# Altium integrated library Inductor-THP_V2.IntLib: 60 symbols
Pins are listed as number, name and electrical type; pins without a type are passive.

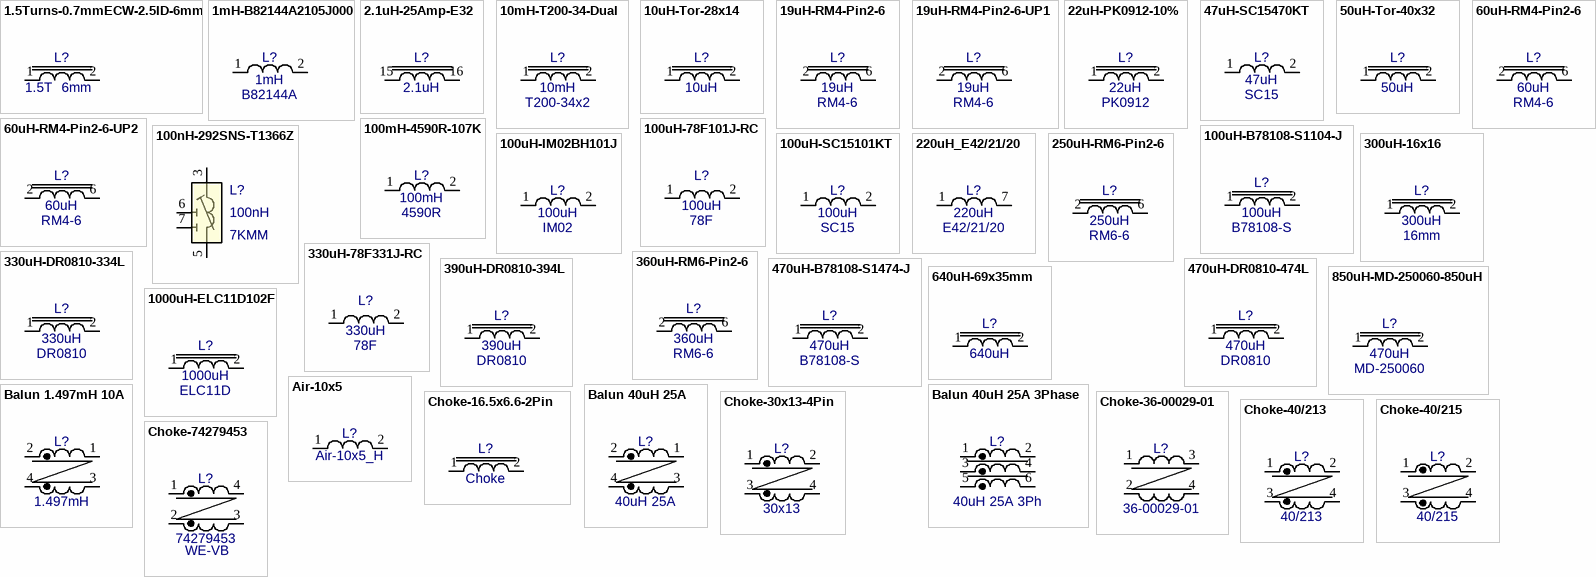
[diagram p0: symbols 1.5Turns-0.7mmECW-2.5ID-6mm to Choke-74279453]

## 1.5Turns-0.7mmECW-2.5ID-6mm
designator L?  value 1.5T  Text2: 6mm  (hidden comment: 1.5Turns-0.7mmECW-2.5ID-6mm)
Inductor 1.5Turns-0.7mmECW-2.5ID-6mm; Manufacturer: Owner; Part Number: 1.5Turns-0.7mmECW-2.5ID-6mm; Package: 1.5T-0.7ECW-2.5ID-6mm; EDM-PN: *; Tol: *; Text1: *
footprint 1.5T-0.7ECW-2.5ID-6mm (1.5Turns-0.7mmECW-2.5ID-6mm)
pins: 1, 2

## 1mH-B82144A2105J000
designator L?, comment value 1mH  Text2: B82144A  (hidden comment: B82144A2105J000)
Inductor Dual Core T200-34; Manufacturer: Epcos; Tol: 5%; Part Number: B82144A2105J000; Package: Ind-50.8x31.75-14mm-2Pin; EDM-PN: *; Text1: *
footprint Ind-THP-12.0x5.2 (Inductor THP 12.0x5.2mm)
pins: 1, 2

## 2.1uH-25Amp-E32
designator L?  value 2.1uH  (hidden comment: 2.1uH-25Amp-E32)
Inductor 25Amp; Manufacturer: Owner; Part Number: 2.1uH-25Amp-E32; Package: E32-7pin+2Power; EDM-PN: *; Tol: *; Text1: *; Text2: *
footprint E32-7pin+2Power (E32-7pin+2Power 35x37.5mm)
pins: 15, 16

## 10mH-T200-34-Dual
designator L?  value 10mH  Text2: T200-34x2  (hidden comment: 10mH-T200-34-Dual)
Inductor Dual Core T200-34; Manufacturer: Owner; Tol: 20%; Part Number: 10mH-T200-34-Dual; Package: Ind-50.8x31.75-14mm-2Pin; EDM-PN: *; Text1: *
footprint Ind-50.8x31.75-14mm-2Pin (Inductor 50.8x31.75mm Dual Core)
pins: 1, 2

## 10uH-Tor-28x14
designator L?  value 10uH  (hidden comment: 10uH-Tor-28x14)
Inductor Radial 20Amp; Manufacturer: Various; Part Number: 10uH-Tor-28x14; Package: IND-Tor-28x14-2Pin; EDM-PN: *; Tol: *; Text1: *; Text2: *
footprint IND-Tor-28x14-2Pin (Tor 28x14mm)
pins: 1, 2

## 19uH-RM4-Pin2-6
designator L?  value 19uH  Text2: RM4-6  (hidden comment: 19uH-RM4-Pin2-6)
Coil RM4 Core; Manufacturer: Various; Part Number: 19uH-RM4-Pin2-6; Package: RM4-6; EDM-PN: *; Text1: *
footprint RM4-6 (RM4 6 pin 9.8x9.8mm)
pins: 2, 6

## 19uH-RM4-Pin2-6-UP1
designator L?  value 19uH  Text2: RM4-6  (hidden comment: 19uH-RM4-Pin2-6-UP1)
Coil RM4 Core (Detnet UP1); Part Number: UP1-19uH-RM4-Pin2-6; Manufacturer: Detnet; Package: RM4-6; EDM-PN: *; Text1: *
footprint RM4-6 (RM4 6 pin 9.8x9.8mm)
pins: 2, 6

## 22uH-PK0912-10%
designator L?, comment value 22uH  Text2: PK0912  (hidden comment: PK0912-220K-C0-B/27M2921)
Inductor Radial 2Amp; Manufacturer: Fenfa; Tol: 10%; Part Number: PK0912-220K-C0-B/27M2921; Package: IND-PK0912; EDM-PN: *; Text1: *
footprint IND-PK0912 (PK0921 10.5x14.0mm)
pins: 1, 2

## 47uH-SC15470KT
designator L?, comment value 47uH  Text2: SC15  (hidden comment: SC15470KT)
Inductor Fixed; Manufacturer: Tyco; Tol: 10%; Part Number: SC15470KT; Package: Ind-THP-SC15; EDM-PN: *; Text1: *
footprint Ind-THP-SC15 (Inductor THP SC15 10.0x4.5mm)
pins: 1, 2

## 50uH-Tor-40x32
designator L?  value 50uH  (hidden comment: 50uH-Tor-40x32)
Inductor Radial; Manufacturer: Various; Part Number: 50uH-Tor-40x32; Package: IND-Tor-40x32-2Pin; EDM-PN: *; Tol: *; Text1: *; Text2: *
footprint IND-Tor-40x32-2Pin (Tor 40.0x32.0mm)
pins: 1, 2

## 60uH-RM4-Pin2-6
designator L?  value 60uH  Text2: RM4-6  (hidden comment: 60uH-RM4-Pin2-6)
Coil RM4 Core; Manufacturer: Various; Part Number: 60uH-RM4-Pin2-6; Package: RM4-6; EDM-PN: *; Text1: *
footprint RM4-6 (RM4 6 pin 9.8x9.8mm)
pins: 2, 6

## 60uH-RM4-Pin2-6-UP2
designator L?  value 60uH  Text2: RM4-6  (hidden comment: 60uH-RM4-Pin2-6-UP2)
Coil RM4 Core (Detnet UP2); Part Number: UP2-60uH-RM4-Pin2-6; Manufacturer: Detnet; Package: RM4-6; EDM-PN: *; Text1: *
footprint RM4-6 (RM4 6 pin 9.8x9.8mm)
pins: 2, 6

## 100mH-4590R-107K
designator L?, comment value 100mH  Text2: 4590R  (hidden comment: 4590R-107K)
Inductor High Current Filter; Manufacturer: API Delevan; Tol: 10%; Part Number: 4590R-107K; Package: IND-4590-22.8x11.55mm; EDM-PN: *; Text1: *
footprint IND-4590-22.8x11.55mm (4590 22.8x11.55mm)
pins: 1, 2

## 100nH-292SNS-T1366Z
designator L?  value 100nH  Text2: 7KMM  (hidden comment: 100nH-292SNS-T1366Z)
Inductor Variable; Manufacturer: Toko; Tol: 6%; Part Number: 292SNS-T1366Z; Package: Toko-7KMM; EDM-PN: *; Text1: *
footprint Toko-7KMM (7KMM 7.8x7.8mm)
pins: 3 1, 5 2, 6 (power), 7 (power)

## 100uH-78F101J-RC
designator L?, comment value 100uH  Text2: 78F  (hidden comment: 78F101J-RC)
Inductor Unshielded Wirewound 160mA; Manufacturer: Bourns; Tol: 5%; Part Number: 78F101J-RC; Package: Ind-THP-7.1x2.79; EDM-PN: *; Text1: *
footprint Ind-THP-7.1x2.79 (Inductor THP 9.4x4.0mm)
pins: 1, 2

## 100uH-B78108-S1104-J
designator L?, comment value 100uH  Text2: B78108-S  (hidden comment: B78108-S1104-J)
Inductor RF Choke; Manufacturer: Epcos; Tol: 20%; Part Number: B78108-S1104-J; Package: Ind-THP-9.4x4.0; EDM-PN: *; Text1: *
footprint Ind-THP-9.4x4.0 (Inductor THP 9.4x4.0mm)
pins: 1, 2

## 100uH-IM02BH101J
designator L?, comment value 100uH  Text2: IM02  (hidden comment: IM02BH101J)
Inductor Fixed; Manufacturer: Vishay; Tol: 5%; Part Number: IM02BH101J; Package: Ind-THP-IM02; EDM-PN: *; Text1: *
footprint Ind-THP-IM02 (Inductor THP IM-02 6.6x2.67mm)
pins: 1, 2

## 100uH-SC15101KT
designator L?, comment value 100uH  Text2: SC15  (hidden comment: SC15101KT)
Inductor Fixed; Manufacturer: Tyco; Tol: 10%; Part Number: SC15101KT; Package: Ind-THP-SC15; EDM-PN: *; Text1: *
footprint Ind-THP-SC15 (Inductor THP SC15 10.0x4.5mm)
pins: 1, 2

## 220uH_E42/21/20
designator L?  value 220uH  Text2: E42/21/20  (hidden comment: 220uH_E42/21/20)
Inductor 12Amp E42/21/20 & FE0250; Manufacturer: Various/Miles-platts; Part Number: E42/21/20 & FE0250; Package: IND-E42-21-20 12PIN-HORZ; EDM-PN: *; Tol: *; Text1: *
footprint IND-E42-21-20 12PIN-HORZ (E42-21-20 12PIN)
pins: 1, 7

## 250uH-RM6-Pin2-6
designator L?  value 250uH  Text2: RM6-6  (hidden comment: 250uH-RM6-Pin2-6)
Coil RM6 Core; Manufacturer: Various; Part Number: 250uH-RM6-Pin2-6; Package: RM6-6; EDM-PN: *; Text1: *
footprint RM6-6 (RM6 6 0.0x0.0mm)
pins: 2, 6

## 300uH-16x16
designator L?, comment value 300uH  Text2: 16mm  (hidden comment: 300uH-16x16mm)
Inductor 16mm Dia; Manufacturer: Owner; Tol: 20%; Part Number: 300uH-16x16mm; Package: Ind-THP-16x16-2P; EDM-PN: *; Text1: *
footprint IND-THP-16x16-2P (Inductor 2Pin 16x16mm)
pins: 1, 2

## 330uH-78F331J-RC
designator L?, comment value 330uH  Text2: 78F  (hidden comment: 78F331J-RC)
Inductor Unshielded Wirewound 100mA; Manufacturer: Bourns; Tol: 5%; Part Number: 78F331J-RC; Package: Ind-THP-7.1x2.79; EDM-PN: *; Text1: *
footprint Ind-THP-7.1x2.79 (Inductor THP 9.4x4.0mm)
pins: 1, 2

## 330uH-DR0810-334L
designator L?, comment value 330uH  Text2: DR0810  (hidden comment: DR0810-334L)
Inductor Power; Manufacturer: Coilcraft; Tol: 10%; Part Number: DR0810-334L; Package: DR0810; EDM-PN: *; Text1: *
footprint DR0810 (DR0810 10.5x12.0mm)
pins: 1, 2

## 360uH-RM6-Pin2-6
designator L?  value 360uH  Text2: RM6-6  (hidden comment: 360uH-RM6-Pin2-6)
Coil RM6 Core; Manufacturer: Various; Part Number: 360uH-RM6-Pin2-6; Package: RM6-6; EDM-PN: *; Text1: *
footprint RM6-6 (RM6 6 0.0x0.0mm)
pins: 2, 6

## 390uH-DR0810-394L
designator L?, comment value 390uH  Text2: DR0810  (hidden comment: DR0810-394L)
Inductor Power; Manufacturer: Coilcraft; Tol: 10%; Part Number: DR0810-394L; Package: DR0810; EDM-PN: *; Text1: *
footprint DR0810 (DR0810 10.5x12.0mm)
pins: 1, 2

## 470uH-B78108-S1474-J
designator L?, comment value 470uH  Text2: B78108-S  (hidden comment: B78108-S1474-J)
Inductor RF Choke; Manufacturer: Epcos; Tol: 20%; Part Number: B78108-S1474-J; Package: Ind-THP-9.4x4.0; EDM-PN: *; Text1: *
footprint Ind-THP-9.4x4.0 (Inductor THP 9.4x4.0mm)
pins: 1, 2

## 470uH-DR0810-474L
designator L?, comment value 470uH  Text2: DR0810  (hidden comment: DR0810-474L)
Inductor Power; Manufacturer: Coilcraft; Tol: 10%; Part Number: DR0810-474L; Package: DR0810; EDM-PN: *; Text1: *
footprint DR0810 (DR0810 10.5x12.0mm)
pins: 1, 2

## 640uH-69x35mm
designator L?  value 640uH  (hidden comment: 640uH-69x35mm)
Inductor Power 10Amp; Manufacturer: Owner; Part Number: 640uH 69x35mm; Package: IND-65x35-2Pin; EDM-PN: *; Tol: *; Text1: *; Text2: *
footprint IND-65x35-2Pin (Inductor 65.0x35.0mm)
pins: 1, 2

## 850uH-MD-250060-850uH
designator L?, comment value 470uH  Text2: MD-250060  (hidden comment: MD-250060-850uH)
Inductor Power; Manufacturer: Owner; Tol: 10%; Part Number: MD-250060-850uH; Package: IND-Tor-72x38-2Pin; EDM-PN: *; Text1: *
footprint IND-Tor-72x38-2Pin (Tor 72.0x38.0mm)
pins: 1, 2

## 1000uH-ELC11D102F
designator L?, comment value 1000uH  Text2: ELC11D  (hidden comment: ELC11D102F)
Inductor RF Choke; Manufacturer: Panasonic; Tol: 10%; Part Number: ELC11D102F; Package: Ind-THP-9.4x4.0; EDM-PN: *; Text1: *
footprint IND-11.5x13.9-Radial (Ind 11.5x11.5mm)
pins: 1, 2

## Air-10x5
designator L?, comment value Air-10x5_H  (hidden comment: Inductor-Air-10x5)
Inductor Air Hand Wound; Manufacturer: Owner; Package: Inductor-Air-10; EDM-PN: *; Tol: *; Text1: *; Part Number: Air-10x5_H; Text2: *
footprint Inductor-Air-10 (Inductor-Air 10.0x5.0mm)
pins: 1, 2

## Balun 1.497mH 10A
designator L?  value 1.497mH  (hidden comment: Balun 1.497mH 10A)
Manufacturer: Owner; Part Number: Balun 1.497mH 10A; Package: CHOKE-26.6x11-4PI-Firing Solenoid; EDM-PN: *; Text1: *; Text2: *; Reutech PN: 5950-98-0165
footprint CHOKE-26.6x11-4PI-Firing Solenoid (CHOKE 26.6x26.6mm)
pins: 1, 2, 3, 4

## Balun 40uH 25A
designator L?  value 40uH 25A  (hidden comment: Balun 40uH 25A)
Balun 40uH 25A (B64290-K618-X830); Manufacturer: Owner; Part Number: Balun 40uH 25A; Package: Balun-28x12-4Pin; EDM-PN: *; Text1: *; Text2: *; Reutech PN: 5950-98-0159
footprint Balun-28x12-4Pin (Balun 28x28mm)
pins: 1, 2, 3, 4

## Balun 40uH 25A 3Phase
designator L?  value 40uH 25A 3Ph  (hidden comment: Balun 40uH 25A 3Phase)
Balun 40uH 25A 3 Phase (B64290-K618-X830); Manufacturer: Owner; Part Number: Balun 40uH 25A 3Ph; Package: Balun-28x12-6Pin; EDM-PN: *; Text1: *; Text2: *; Reutech PN: 5950-98-0160
footprint Balun-28x12-6Pin (Balun 28x28mm)
pins: 1, 2, 3, 4, 5, 6

## Choke-16.5x6.6-2Pin
designator L?, comment value Choke  (hidden comment: Choke 16.5x6.6mm)
Manufacturer: Owner; Part Number: Choke 16.5x6.6mm; Package: IND-THP-16.5X6.6-2P; EDM-PN: *; Tol: *; Text1: *; Text2: *
footprint IND-THP-16.5X6.6-2P (Inductor THP 16.5x6.6mm)
pins: 1, 2

## Choke-30x13-4Pin
designator L?, comment value 30x13  (hidden comment: Choke-30x13)
Choke Common Mode; Manufacturer: Owner; Part Number: 30x13; Package: CHOKE-30x13-4Pin; EDM-PN: *; Text1: *; Text2: *
footprint CHOKE-30x13-4Pin (CHOKE 30.0x30.0mm)
pins: 1, 2, 3, 4

## Choke-36-00029-01
designator L?  value 36-00029-01  (hidden comment: Choke-36-00029-01)
Choke Common-Mode 350uH 40A; Manufacturer: Vicor; Part Number: 36-00029-01; Package: Choke-36-00029-01; EDM-PN: *; Text1: *; Text2: *
footprint Choke-36-00029-01 (Choke 43.2x43.2mm)
pins: 1, 2, 3, 4

## Choke-40/213
designator L?  value 40/213  (hidden comment: Choke-40/213)
Choke Common Mode 10Amp 266uH; Manufacturer: Mantech; Part Number: 40/213; Package: CHOKE-40/213; EDM-PN: *; Text1: *; Text2: *
footprint CHOKE-40/213 (CHOKE-40/213 26.0x26.0mm)
pins: 1, 2, 3, 4

## Choke-40/215
designator L?  value 40/215  (hidden comment: Choke-40/215)
Choke Common Mode 6Amp 680uH; Manufacturer: Mantech; Part Number: 40/215; Package: CHOKE-40/215; EDM-PN: *; Text1: *; Text2: *
footprint CHOKE-40/215 (CHOKE-40/215 25.0x25.0mm)
pins: 1, 2, 3, 4

## Choke-74279453
designator L?  value 74279453  Text2: WE-VB  (hidden comment: Choke-74279453)
Choke Line 80uH WE-VB; Manufacturer: Wurth; Part Number: 74279453; Package: WE-VB-6.4x7.5; EDM-PN: *; Text1: *
footprint WE-VB-7.5x6.4 (Choke WE-VB 7.5x6.4mm)
pins: 1, 2, 3, 4

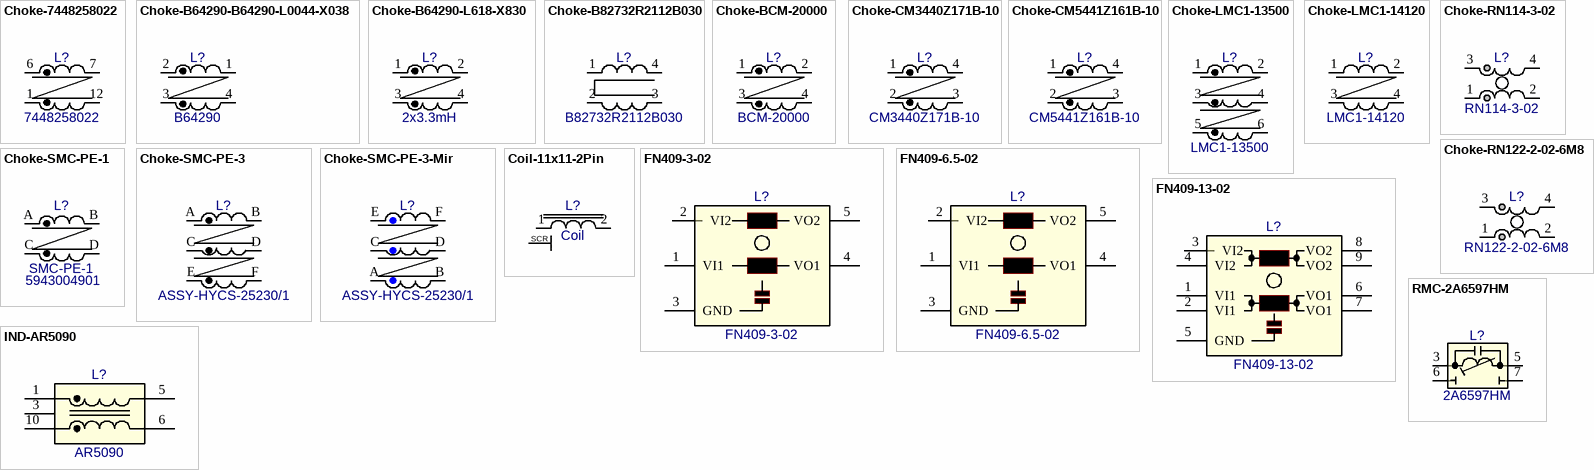
[diagram p1: symbols Choke-7448258022 to RMC-2A6597HM]

## Choke-7448258022
designator L?, comment 7448258022
Choke Common Mode 2.2MH 8A 2Line; Manufacturer: Wurth; Part Number: 7448258022; Package: WE-CMB-XL; EDM-PN: *; Text1: *; Text2: *; Reutech PN: *; Value: 7448258022
footprint WE-CMB-XL (WE-CMB-XL 30.0x21.0mm)
pins: 1, 6, 7, 12

## Choke-B64290-B64290-L0044-X038
designator L?  value B64290  (hidden comment: Choke-B64290-B64290-L0044-X038)
Choke Common Mode B64290-L0044-X038; Manufacturer: Owner; Part Number: 64290-L0044-X038; Package: CHOKE-26.6x11-4PI; EDM-PN: *; Text1: *; Text2: *
footprint CHOKE-18x7.5-4PI-NO-MTG (CHOKE 8x7.5mm)
pins: 1, 2, 3, 4

## Choke-B64290-L618-X830
designator L?  value 2x3.3mH  (hidden comment: Choke-B64290-L618-X830)
Choke Common Mode B64290-L618-X830 2x27T/0.71mm; Manufacturer: Owner; Part Number: B64290-L618-X830; Package: CHOKE-26.6x11-4PI; EDM-PN: *; Text1: *; Text2: *
footprint CHOKE-26.6x11-4PI (CHOKE 26.6x26.6mm)
pins: 1, 2, 3, 4

## Choke-B82732R2112B030
designator L?, comment B82732R2112B030
Choke Line Common Mode; Manufacturer: Owner; Part Number: B82732R2112B030; Package: Choke-B82732R; EDM-PN: *; Text1: *; Text2: *; Value: B82732R2112B030
footprint Choke-B82732R (Choke-B82732R 24.0x16.5mm)
pins: 1, 2, 3, 4

## Choke-BCM-20000
designator L?  value BCM-20000  (hidden comment: Choke-BCM-20000)
Choke Common Mode 28-717-44  (12 Turns 0.6mm Wire); Manufacturer: BAE; Part Number: 28-717-44; Package: CHOKE-BCM-20000; EDM-PN: *; Text1: *; Text2: *
footprint CHOKE-BCM-20000 (CHOKE-BCM-20000 13.0x7.0mm)
pins: 1, 2, 3, 4

## Choke-CM3440Z171B-10
designator L?, comment CM3440Z171B-10
Choke Common Mode 20A 170Ohm; Manufacturer: Laird-Signal Integrity; Reutech PN: 5950-CH-0073; Part Number: CM3440Z171B-10; Package: CHOKE-CM3440Z171B-10; EDM-PN: *; Text1: *; Text2: *; Value: CM3440Z171B-10
footprint CHOKE-CM3440Z171B-10 (CM3440Z171B-10 10.0x8.5mm)
pins: 1, 2, 3, 4

## Choke-CM5441Z161B-10
designator L?  value CM5441Z161B-10  (hidden comment: Choke-CM5441Z161B-10)
Choke Common Mode 75A 160Ohm; Manufacturer: Laird-Signal Integrity; Part Number: CM5441Z161B-10; Package: CHOKE-CM5441Z161B-10; EDM-PN: *; Text1: *; Text2: *; Reutech PN: 5950-99-0447
footprint CHOKE-CM5441Z161B-10 (CM5441Z161B-10 13.72x10.41mm)
pins: 1, 2, 3, 4

## Choke-LMC1-13500
designator L?  value LMC1-13500  (hidden comment: Choke-LMC1-13500)
Choke LMC1-13500; Manufacturer: Kreon; Part Number: LMC1-13500; Package: CMC-Tor-11.5x5x9-6pin; EDM-PN: *; Text1: *; Text2: *
footprint CMC-Tor-11.5x5x9-6pin (CMC-Torodial 11.5x5x9mm - 6pin)
pins: 1, 2, 3, 4, 5, 6

## Choke-LMC1-14120
designator L?  value LMC1-14120  (hidden comment: Choke-LMC1-14120)
Choke LMC1-14120; Manufacturer: Kreon; Part Number: LMC1-14120; Package: CMC-Tor-23.5x13.8x6.4; EDM-PN: *; Text1: *; Text2: *
footprint CMC-Tor-23.5x13.8x6.4 (CMC-Torodial 23.5x13.8x6.4mm)
pins: 1, 2, 3, 4

## Choke-RN114-3-02
designator L?  value RN114-3-02  (hidden comment: Choke-RN114-3-02)
Choke Current-Compensated; Manufacturer: Schaffner; Part Number: RN114-3-02; Package: RN114; EDM-PN: *; Text1: *
footprint RN114 (RN114 21.5x22.5mm)
pins: 1, 2, 3, 4

## Choke-RN122-2-02-6M8
designator L?, comment RN122-2-02-6M8
Choke Common Mode 6.8mH 2A; Manufacturer: Schaffner; Part Number: RN122-2-02-6M8; Package: RN122; EDM-PN: *; Text1: *; Value: RN122-2-02-6M8
footprint RN122 (RN122 22.5x21.5mm)
pins: 1, 2, 3, 4

## Choke-SMC-PE-1
designator L?  value SMC-PE-1  Text2: 5943004901  (hidden comment: Choke-SMC-PE-1)
Choke SMC-PE 1; Manufacturer: Kreon; Part Number: SMC-PE-1; Package: Choke-SMC-PE-1; EDM-PN: *; Text1: *
footprint Choke-SMC-PE-1 (Choke 1 16.0xx6.35mm)
pins: A, B, C, D

## Choke-SMC-PE-3
designator L?  value ASSY-HYCS-25230/1  (hidden comment: Choke-SMC-PE-3)
Choke SMC-PE 3; Manufacturer: Kreon; Text2: 5943004901; Part Number: ASSY-HYCS-25230/1; Package: Choke-SMC-PE-3; EDM-PN: *; Text1: *
footprint Choke-SMC-PE-3 (Choke 3 16.0xx6.35mm)
pins: A, B, C, D, E, F

## Choke-SMC-PE-3-Mir
designator L?, comment value ASSY-HYCS-25230/1  (hidden comment: Choke-SMC-PE-3-M)
Choke SMC-PE 3; Manufacturer: Kreon; Text2: 5943004901; Part Number: ASSY-HYCS-25230/1; Package: Choke-SMC-PE-3; EDM-PN: *; Text1: *
footprint Choke-SMC-PE-3 (Choke 3 16.0xx6.35mm)
pins: A, B, C, D, E, F

## Coil-11x11-2Pin
designator L?, comment value Coil  (hidden comment: Choke 16.5x6.6mm)
Coil Assy 11x11-2Pin; Manufacturer: Owner; Part Number: Coil-11x11-2Pin; Package: COIL-ASSY 11X11-2P; EDM-PN: *; Tol: *; Text1: *; Text2: *
footprint COIL-ASSY 11X11-2P (Coil Assy 11x11mm 2Pin)
pins: 1, 2, M1 SCR, M2 SCR

## FN409-3-02
designator L?
Filter Input 75VDC 3Amp; Manufacturer: Schaffner; Part Number: FN409-3-02; Package: FN409-3-6.5A; EDM-PN: *; Text1: *; Text2: *; Value: FN409-3-02
footprint FN409-3-6.5A (FN409-3-6.5A 50.8X27.9mm)
pins: 1 VI1, 2 VI2, 3 GND, 4 VO1, 5 VO2

## FN409-6.5-02
designator L?
Filter Input 75VDC 6.5Amp; Manufacturer: Schaffner; Part Number: FN409-6.5-02; Package: FN409-3-6.5A; EDM-PN: *; Text1: *; Text2: *; Value: FN409-6.5-02
footprint FN409-3-6.5A (FN409-3-6.5A 50.8X27.9mm)
pins: 1 VI1, 2 VI2, 3 GND, 4 VO1, 5 VO2

## FN409-13-02
designator L?
Filter Input 75VDC 13Amp; Manufacturer: Schaffner; Part Number: FN409-13-02; Package: FN409-13; EDM-PN: *; Text1: *; Text2: *; Value: FN409-13-02
footprint FN409-13 (FN409 13 40.6x50.8mm)
pins: 1 VI1, 2 VI1, 3 VI2, 4 VI2, 5 GND, 6 VO1, 7 VO1, 8 VO2, 9 VO2

## IND-AR5090
designator L?, comment AR5090
Inductor for POTS Splitter Application; Manufacturer: Best-Buy; Package: Ind-AR5090; EDM-PN: *; Text2: *; Text1: *; Part Number: AR5090; Value: AR5090
footprint Ind-AR5090 (AR5090 13.5x12.7mm)
pins: 1, 3 NC, 5, 6, 10

## RMC-2A6597HM
designator L?  value 2A6597HM  (hidden comment: RMC-2A6597HM)
Inductor Variable; Manufacturer: Toko; Tol: 20%; Text2: 10EZ; Part Number: RMC-2A6597HM; Package: Toko-10EZ; EDM-PN: *; Text1: *
footprint Toko-10EZ (10EZ 10.5x10.5mm)
pins: 3 1, 5 2, 6 (power), 7 (power)